# Altium schematic symbol library 13-Logicold 逻辑 IC.SchLib: 297 symbols (part 10 of 30)
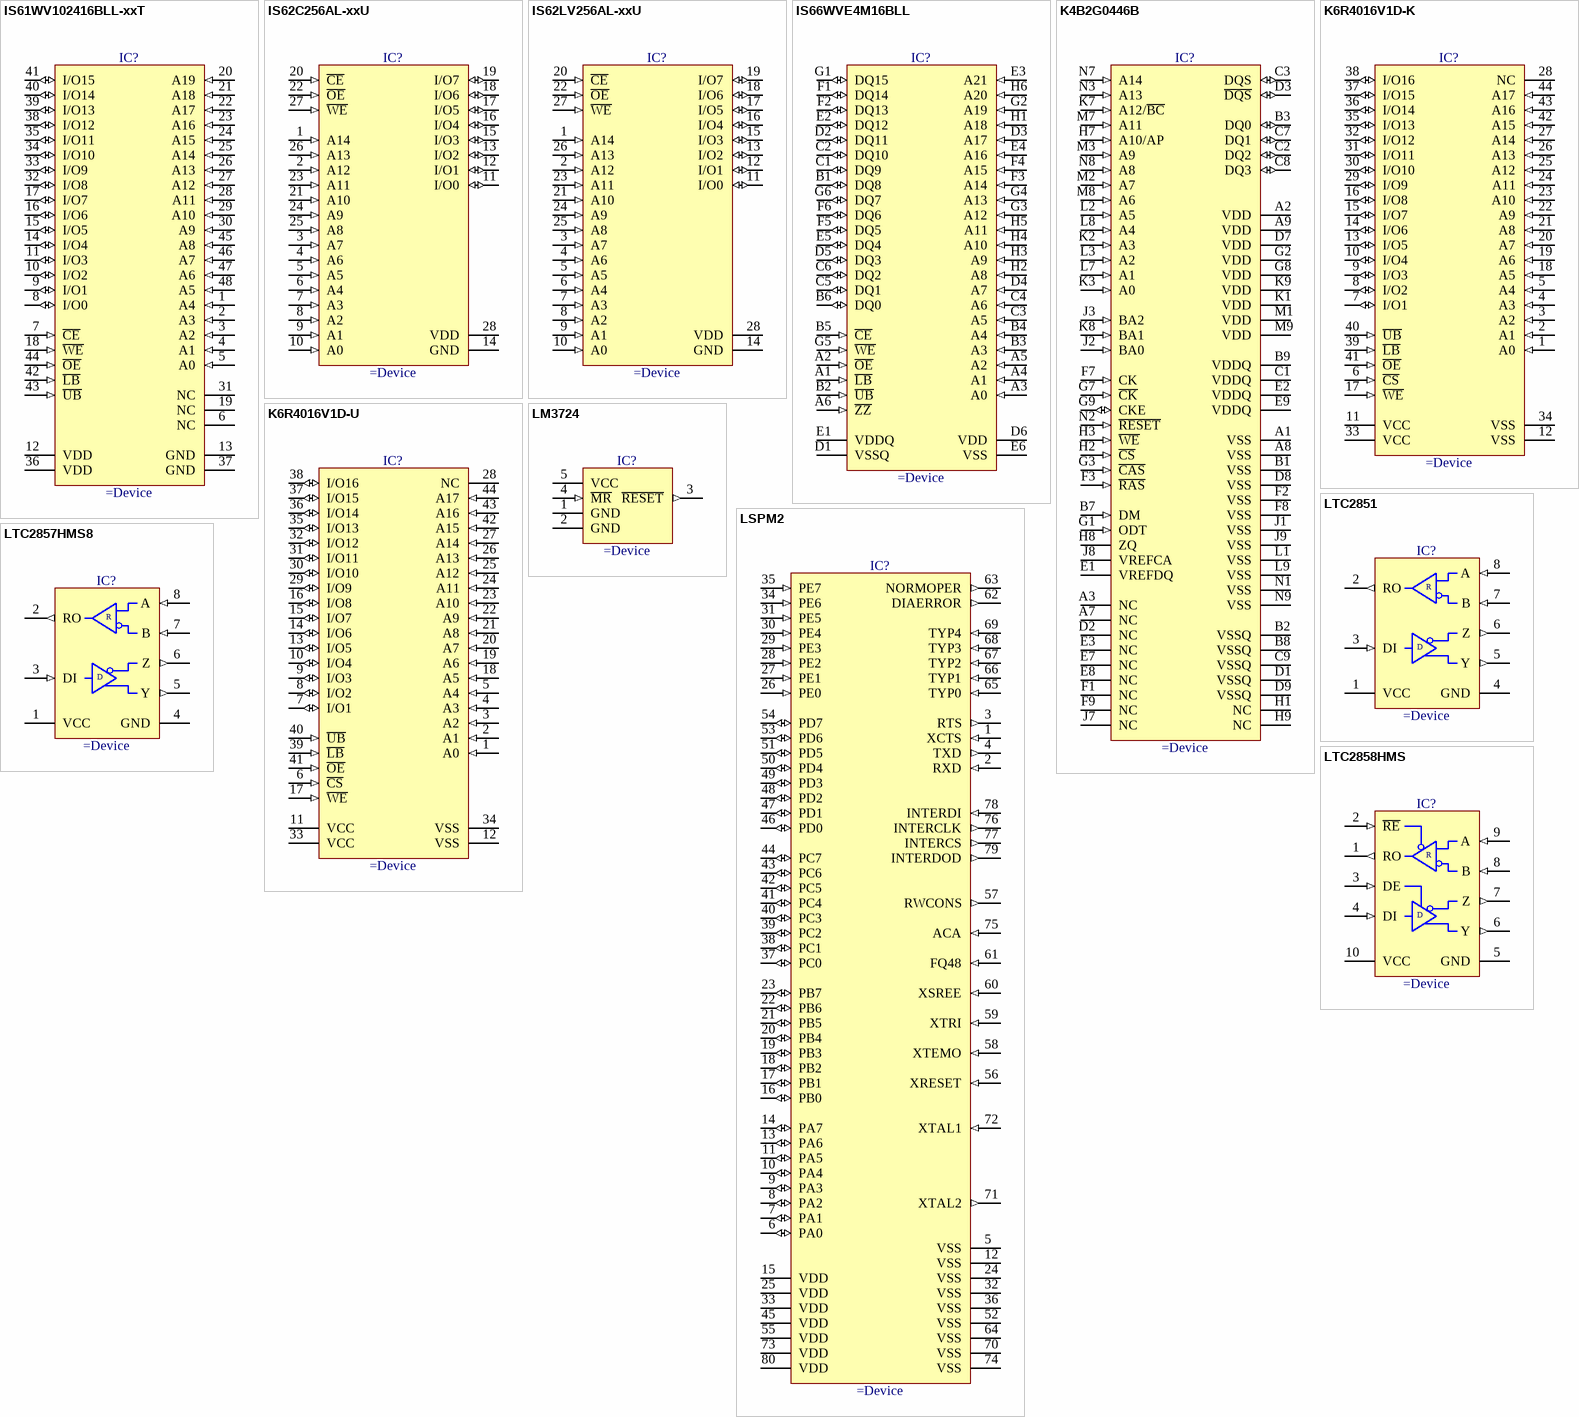
[diagram p171: symbols IS61WV102416BLL-xxT to LTC2858HMS]

## K6R4016V1D-K
designator IC?
4Mbit (256K x 16 Bit) High-Speed CMOS Static RAM
pins: 1 A0 (in), 2 A1 (in), 3 A2 (in), 4 A3 (in), 5 A4 (in), 6 ~{CS} (in), 7 I/O1 (io), 8 I/O2 (io), 9 I/O3 (io), 10 I/O4 (io), 11 VCC (power), 12 VSS (power), 13 I/O5 (io), 14 I/O6 (io), 15 I/O7 (io), 16 I/O8 (io), 17 ~{WE} (in), 18 A5 (in), 19 A6 (in), 20 A7 (in), 21 A8 (in), 22 A9 (in), 23 A10 (in), 24 A11 (in), 25 A12 (in), 26 A13 (in), 27 A14 (in), 28 NC, 29 I/O9 (io), 30 I/O10 (io), 31 I/O11 (io), 32 I/O12 (io), 33 VCC (power), 34 VSS (power), 35 I/O13 (io), 36 I/O14 (io), 37 I/O15 (io), 38 I/O16 (io), 39 ~{LB} (in), 40 ~{UB} (in), 41 ~{OE} (in), 42 A15 (in), 43 A16 (in), 44 A17 (in)

## K6R4016V1D-U
designator IC?
4Mbit (256K x 16 Bit) High-Speed CMOS Static RAM
pins: 1 A0 (in), 2 A1 (in), 3 A2 (in), 4 A3 (in), 5 A4 (in), 6 ~{CS} (in), 7 I/O1 (io), 8 I/O2 (io), 9 I/O3 (io), 10 I/O4 (io), 11 VCC (power), 12 VSS (power), 13 I/O5 (io), 14 I/O6 (io), 15 I/O7 (io), 16 I/O8 (io), 17 ~{WE} (in), 18 A5 (in), 19 A6 (in), 20 A7 (in), 21 A8 (in), 22 A9 (in), 23 A10 (in), 24 A11 (in), 25 A12 (in), 26 A13 (in), 27 A14 (in), 28 NC, 29 I/O9 (io), 30 I/O10 (io), 31 I/O11 (io), 32 I/O12 (io), 33 VCC (power), 34 VSS (power), 35 I/O13 (io), 36 I/O14 (io), 37 I/O15 (io), 38 I/O16 (io), 39 ~{LB} (in), 40 ~{UB} (in), 41 ~{OE} (in), 42 A15 (in), 43 A16 (in), 44 A17 (in)

## LM3724
designator IC?
5-Pin Microprocessor Reset Circuit
pins: 1 GND (power), 2 GND (power), 3 ~{RESET} (out), 4 ~{MR} (in), 5 VCC (power)

## LSPM2
designator IC?
ASIC PROFIBUS Multiplexer
pins: 1 XCTS (in), 2 RXD (in), 3 RTS (out), 4 TXD (out), 5 VSS (power), 6 PA0 (io), 7 PA1 (io), 8 PA2 (io), 9 PA3 (io), 10 PA4 (io), 11 PA5 (io), 12 VSS (power), 13 PA6 (io), 14 PA7 (io), 15 VDD (power), 16 PB0 (io), 17 PB1 (io), 18 PB2 (io), 19 PB3 (io), 20 PB4 (io), 21 PB5 (io), 22 PB6 (io), 23 PB7 (io), 24 VSS (power), 25 VDD (power), 26 PE0 (in), 27 PE1 (in), 28 PE2 (in), 29 PE3 (in), 30 PE4 (in), 31 PE5 (in), 32 VSS (power), 33 VDD (power), 34 PE6 (in), 35 PE7 (in), 36 VSS (power), 37 PC0 (io), 38 PC1 (io), 39 PC2 (io), 40 PC3 (io), 41 PC4 (io), 42 PC5 (io), 43 PC6 (io), 44 PC7 (io), 45 VDD (power), 46 PD0 (io), 47 PD1 (io), 48 PD2 (io), 49 PD3 (io), 50 PD4 (io), 51 PD5 (io), 52 VSS (power), 53 PD6 (io), 54 PD7 (io), 55 VDD (power), 56 XRESET (in), 57 RWCONS (out), 58 XTEMO (in), 59 XTRI (in), 60 XSREE (in), 61 FQ48 (in), 62 DIAERROR (out), 63 NORMOPER (out), 64 VSS (power), 65 TYP0 (in), 66 TYP1 (in), 67 TYP2 (in), 68 TYP3 (in), 69 TYP4 (in), 70 VSS (power), 71 XTAL2 (out), 72 XTAL1 (in), 73 VDD (power), 74 VSS (power), 75 ACA (in), 76 INTERCLK (out), 77 INTERCS (out), 78 INTERDI (in), 79 INTERDOD (out), 80 VDD (power)

## LTC2851
designator IC?
3.3V 20Mbps RS485/RS422 Transceivers
pins: 1 VCC (power), 2 RO (out), 3 DI (in), 4 GND (power), 5 Y (out), 6 Z (out), 7 B (in), 8 A (in)
text: R; D

## LTC2857HMS8
designator IC?
20Mbps and Slew Rate Limited 15kV RS485/RS422 Transceivers
pins: 1 VCC (power), 2 RO (out), 3 DI (in), 4 GND (power), 5 Y (out), 6 Z (out), 7 B (in), 8 A (in)
text: R; D

## LTC2858HMS
designator IC?
20Mbps and Slew Rate Limited 15kV RS485/RS422 Full Duplex Transceivers With Low Power Shut Down Mode
pins: 1 RO (out), 2 ~{RE} (in), 3 DE (in), 4 DI (in), 5 GND (power), 6 Y (out), 7 Z (out), 8 B (in), 9 A (in), 10 VCC (power)
text: R; D

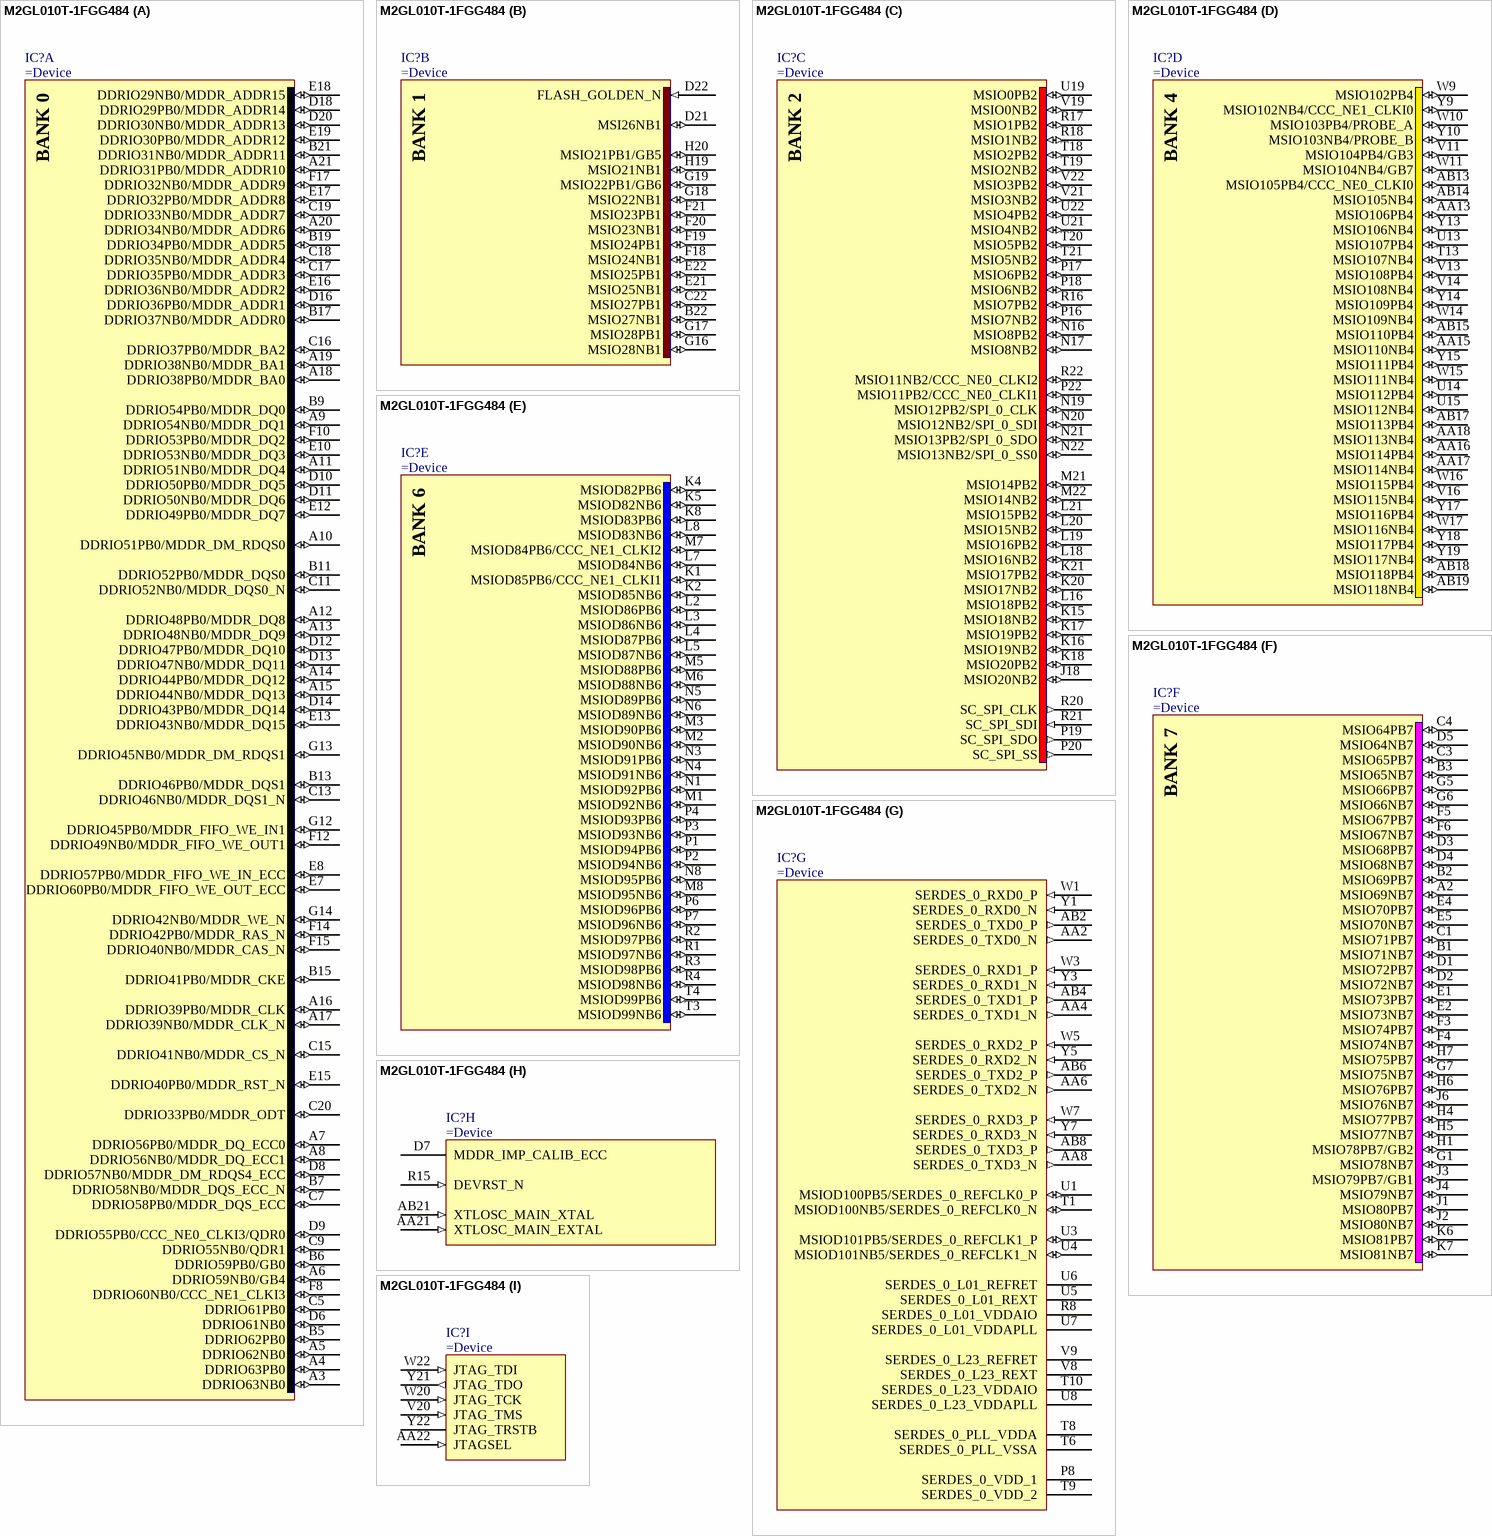
[diagram p56: symbol M2GL010T-1FGG484]

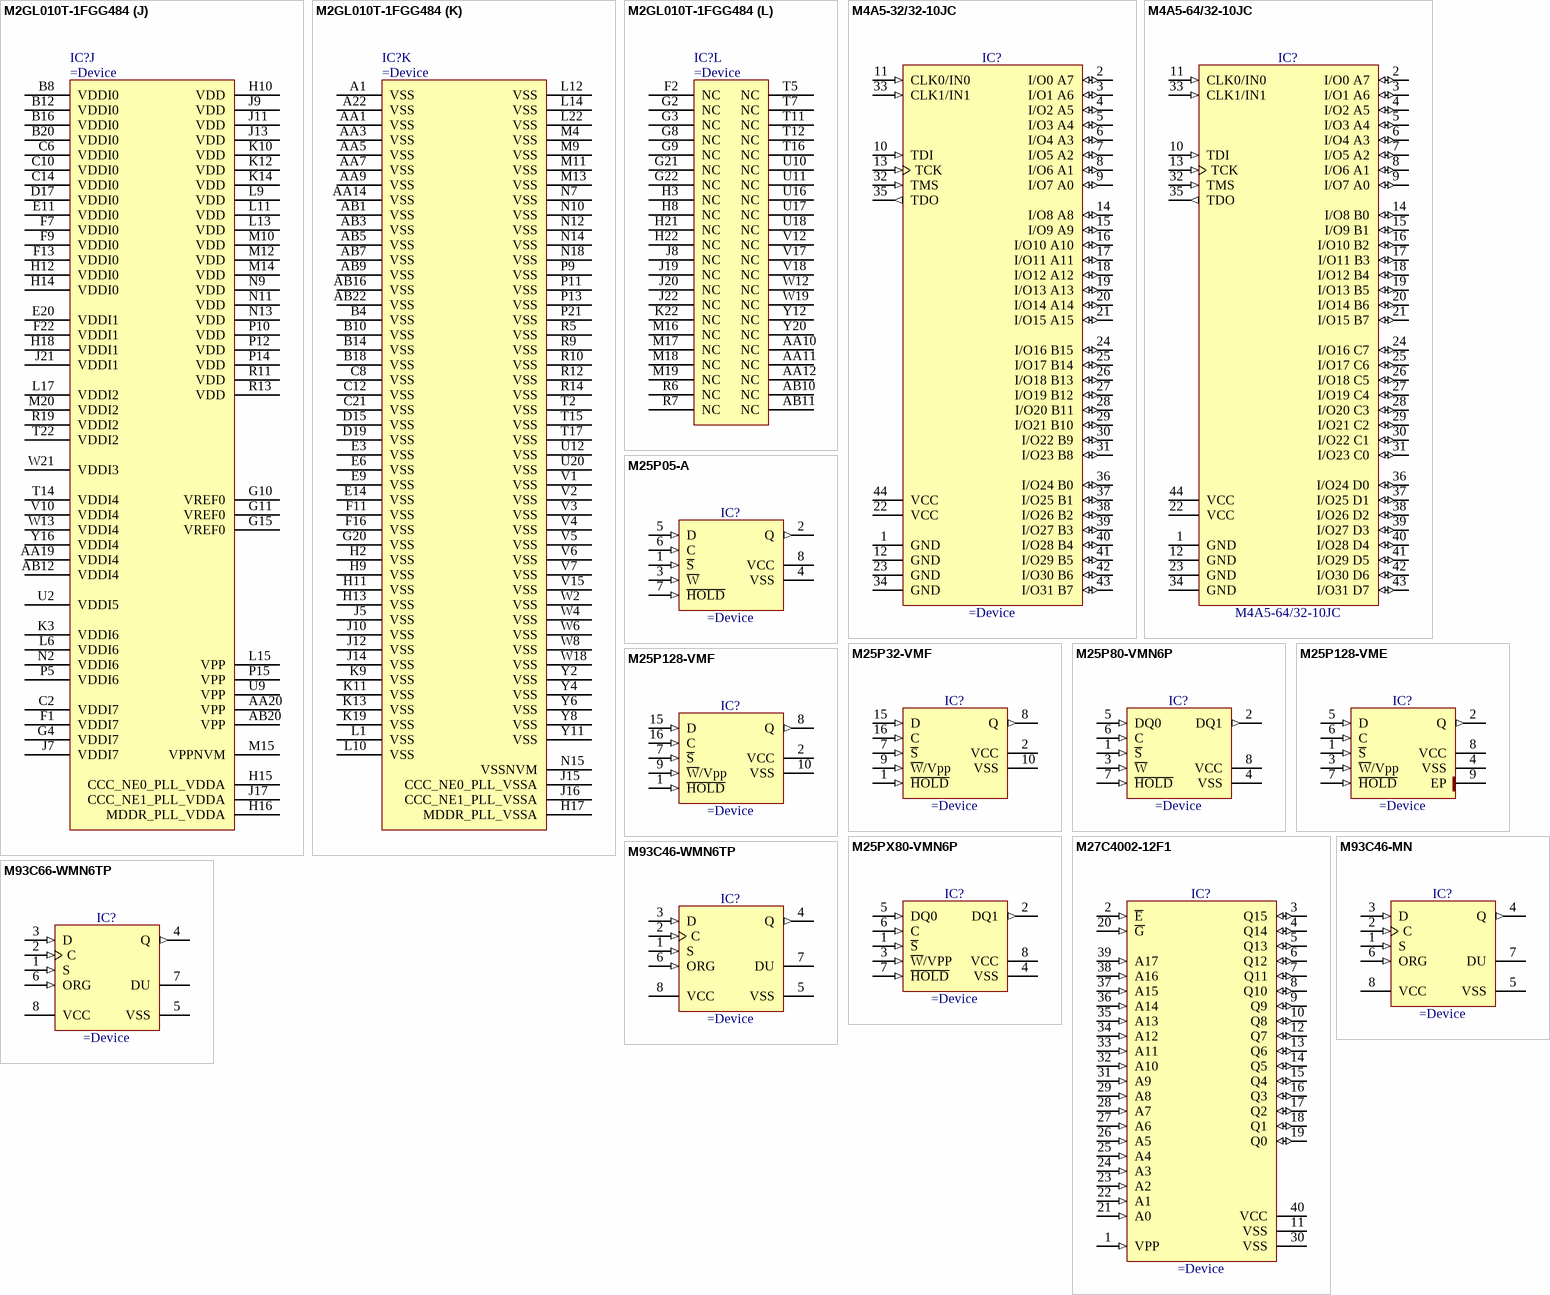
[diagram p57: symbols M2GL010T-1FGG484 to M93C66-WMN6TP]

## M2GL010T-1FGG484
designator IC?
IGLOO2 FPGA, 12084 Cells, 233 User I/Os,  2 PLLs, 912K RAM, 1 PCIe, 484-Pin FBGA, Commercial Grade
part A pins: A3 DDRIO63NB0 (io), A4 DDRIO63PB0 (io), A5 DDRIO62NB0 (io), A6 DDRIO59NB0/GB4 (io), A7 DDRIO56PB0/MDDR_DQ_ECC0 (io), A8 DDRIO56NB0/MDDR_DQ_ECC1 (io), A9 DDRIO54NB0/MDDR_DQ1 (io), A10 DDRIO51PB0/MDDR_DM_RDQS0 (io), A11 DDRIO51NB0/MDDR_DQ4 (io), A12 DDRIO48PB0/MDDR_DQ8 (io), A13 DDRIO48NB0/MDDR_DQ9 (io), A14 DDRIO44PB0/MDDR_DQ12 (io), A15 DDRIO44NB0/MDDR_DQ13 (io), A16 DDRIO39PB0/MDDR_CLK (io), A17 DDRIO39NB0/MDDR_CLK_N (io), A18 DDRIO38PB0/MDDR_BA0 (io), A19 DDRIO38NB0/MDDR_BA1 (io), A20 DDRIO34NB0/MDDR_ADDR6 (io), A21 DDRIO31PB0/MDDR_ADDR10 (io), B5 DDRIO62PB0 (io), B6 DDRIO59PB0/GB0 (io), B7 DDRIO58NB0/MDDR_DQS_ECC_N (io), B9 DDRIO54PB0/MDDR_DQ0 (io), B11 DDRIO52PB0/MDDR_DQS0 (io), B13 DDRIO46PB0/MDDR_DQS1 (io), B15 DDRIO41PB0/MDDR_CKE (io), B17 DDRIO37NB0/MDDR_ADDR0 (io), B19 DDRIO34PB0/MDDR_ADDR5 (io), B21 DDRIO31NB0/MDDR_ADDR11 (io), C5 DDRIO61PB0 (io), C7 DDRIO58PB0/MDDR_DQS_ECC (io), C9 DDRIO55NB0/QDR1 (io), C11 DDRIO52NB0/MDDR_DQS0_N (io), C13 DDRIO46NB0/MDDR_DQS1_N (io), C15 DDRIO41NB0/MDDR_CS_N (io), C16 DDRIO37PB0/MDDR_BA2 (io), C17 DDRIO35PB0/MDDR_ADDR3 (io), C18 DDRIO35NB0/MDDR_ADDR4 (io), C19 DDRIO33NB0/MDDR_ADDR7 (io), C20 DDRIO33PB0/MDDR_ODT (io), D6 DDRIO61NB0 (io), D8 DDRIO57NB0/MDDR_DM_RDQS4_ECC (io), D9 DDRIO55PB0/CCC_NE0_CLKI3/QDR0 (io), D10 DDRIO50PB0/MDDR_DQ5 (io), D11 DDRIO50NB0/MDDR_DQ6 (io), D12 DDRIO47PB0/MDDR_DQ10 (io), D13 DDRIO47NB0/MDDR_DQ11 (io), D14 DDRIO43PB0/MDDR_DQ14 (io), D16 DDRIO36PB0/MDDR_ADDR1 (io), D18 DDRIO29PB0/MDDR_ADDR14 (io), D20 DDRIO30NB0/MDDR_ADDR13 (io), E7 DDRIO60PB0/MDDR_FIFO_WE_OUT_ECC (io), E8 DDRIO57PB0/MDDR_FIFO_WE_IN_ECC (io), E10 DDRIO53NB0/MDDR_DQ3 (io), E12 DDRIO49PB0/MDDR_DQ7 (io), E13 DDRIO43NB0/MDDR_DQ15 (io), E15 DDRIO40PB0/MDDR_RST_N (io), E16 DDRIO36NB0/MDDR_ADDR2 (io), E17 DDRIO32PB0/MDDR_ADDR8 (io), E18 DDRIO29NB0/MDDR_ADDR15 (io), E19 DDRIO30PB0/MDDR_ADDR12 (io), F8 DDRIO60NB0/CCC_NE1_CLKI3 (io), F10 DDRIO53PB0/MDDR_DQ2 (io), F12 DDRIO49NB0/MDDR_FIFO_WE_OUT1 (io), F14 DDRIO42PB0/MDDR_RAS_N (io), F15 DDRIO40NB0/MDDR_CAS_N (io), F17 DDRIO32NB0/MDDR_ADDR9 (io), G12 DDRIO45PB0/MDDR_FIFO_WE_IN1 (io), G13 DDRIO45NB0/MDDR_DM_RDQS1 (io), G14 DDRIO42NB0/MDDR_WE_N (io)
part B pins: B22 MSIO27NB1 (io), C22 MSIO27PB1 (io), D21 MSI26NB1 (io), D22 FLASH_GOLDEN_N (in), E21 MSIO25NB1 (io), E22 MSIO25PB1 (io), F18 MSIO24NB1 (io), F19 MSIO24PB1 (io), F20 MSIO23NB1 (io), F21 MSIO23PB1 (io), G16 MSIO28NB1 (io), G17 MSIO28PB1 (io), G18 MSIO22NB1 (io), G19 MSIO22PB1/GB6 (io), H19 MSIO21NB1 (io), H20 MSIO21PB1/GB5 (io)
part C pins: J18 MSIO20NB2 (io), K15 MSIO18NB2 (io), K16 MSIO19NB2 (io), K17 MSIO19PB2 (io), K18 MSIO20PB2 (io), K20 MSIO17NB2 (io), K21 MSIO17PB2 (io), L16 MSIO18PB2 (io), L18 MSIO16NB2 (io), L19 MSIO16PB2 (io), L20 MSIO15NB2 (io), L21 MSIO15PB2 (io), M21 MSIO14PB2 (io), M22 MSIO14NB2 (io), N16 MSIO8PB2 (io), N17 MSIO8NB2 (io), N19 MSIO12PB2/SPI_0_CLK (io), N20 MSIO12NB2/SPI_0_SDI (io), N21 MSIO13PB2/SPI_0_SDO (io), N22 MSIO13NB2/SPI_0_SS0 (io), P16 MSIO7NB2 (io), P17 MSIO6PB2 (io), P18 MSIO6NB2 (io), P19 SC_SPI_SDO (out), P20 SC_SPI_SS (out), P22 MSIO11PB2/CCC_NE0_CLKI1 (io), R16 MSIO7PB2 (io), R17 MSIO1PB2 (io), R18 MSIO1NB2 (io), R20 SC_SPI_CLK (out), R21 SC_SPI_SDI (in), R22 MSIO11NB2/CCC_NE0_CLKI2 (io), T18 MSIO2PB2 (io), T19 MSIO2NB2 (io), T20 MSIO5PB2 (io), T21 MSIO5NB2 (io), U19 MSIO0PB2 (io), U21 MSIO4NB2 (io), U22 MSIO4PB2 (io), V19 MSIO0NB2 (io), V21 MSIO3NB2 (io), V22 MSIO3PB2 (io)
part D pins: AA13 MSIO106PB4 (io), AA15 MSIO110NB4 (io), AA16 MSIO114PB4 (io), AA17 MSIO114NB4 (io), AA18 MSIO113NB4 (io), AB13 MSIO105PB4/CCC_NE0_CLKI0 (io), AB14 MSIO105NB4 (io), AB15 MSIO110PB4 (io), AB17 MSIO113PB4 (io), AB18 MSIO118PB4 (io), AB19 MSIO118NB4 (io), T13 MSIO107NB4 (io), U13 MSIO107PB4 (io), U14 MSIO112PB4 (io), U15 MSIO112NB4 (io), V11 MSIO104PB4/GB3 (io), V13 MSIO108PB4 (io), V14 MSIO108NB4 (io), V16 MSIO115NB4 (io), W9 MSIO102PB4 (io), W10 MSIO103PB4/PROBE_A (io), W11 MSIO104NB4/GB7 (io), W14 MSIO109NB4 (io), W15 MSIO111NB4 (io), W16 MSIO115PB4 (io), W17 MSIO116NB4 (io), Y9 MSIO102NB4/CCC_NE1_CLKI0 (io), Y10 MSIO103NB4/PROBE_B (io), Y13 MSIO106NB4 (io), Y14 MSIO109PB4 (io), Y15 MSIO111PB4 (io), Y17 MSIO116PB4 (io), Y18 MSIO117PB4 (io), Y19 MSIO117NB4 (io)
part E pins: K1 MSIOD85PB6/CCC_NE1_CLKI1 (io), K2 MSIOD85NB6 (io), K4 MSIOD82PB6 (io), K5 MSIOD82NB6 (io), K8 MSIOD83PB6 (io), L2 MSIOD86PB6 (io), L3 MSIOD86NB6 (io), L4 MSIOD87PB6 (io), L5 MSIOD87NB6 (io), L7 MSIOD84NB6 (io), L8 MSIOD83NB6 (io), M1 MSIOD92NB6 (io), M2 MSIOD90NB6 (io), M3 MSIOD90PB6 (io), M5 MSIOD88PB6 (io), M6 MSIOD88NB6 (io), M7 MSIOD84PB6/CCC_NE1_CLKI2 (io), M8 MSIOD95NB6 (io), N1 MSIOD92PB6 (io), N3 MSIOD91PB6 (io), N4 MSIOD91NB6 (io), N5 MSIOD89PB6 (io), N6 MSIOD89NB6 (io), N8 MSIOD95PB6 (io), P1 MSIOD94PB6 (io), P2 MSIOD94NB6 (io), P3 MSIOD93NB6 (io), P4 MSIOD93PB6 (io), P6 MSIOD96PB6 (io), P7 MSIOD96NB6 (io), R1 MSIOD97NB6 (io), R2 MSIOD97PB6 (io), R3 MSIOD98PB6 (io), R4 MSIOD98NB6 (io), T3 MSIOD99NB6 (io), T4 MSIOD99PB6 (io)
part F pins: A2 MSIO69NB7 (io), B1 MSIO71NB7 (io), B2 MSIO69PB7 (io), B3 MSIO65NB7 (io), C1 MSIO71PB7 (io), C3 MSIO65PB7 (io), C4 MSIO64PB7 (io), D1 MSIO72PB7 (io), D2 MSIO72NB7 (io), D3 MSIO68PB7 (io), D4 MSIO68NB7 (io), D5 MSIO64NB7 (io), E1 MSIO73PB7 (io), E2 MSIO73NB7 (io), E4 MSIO70PB7 (io), E5 MSIO70NB7 (io), F3 MSIO74PB7 (io), F4 MSIO74NB7 (io), F5 MSIO67PB7 (io), F6 MSIO67NB7 (io), G1 MSIO78NB7 (io), G5 MSIO66PB7 (io), G6 MSIO66NB7 (io), G7 MSIO75NB7 (io), H1 MSIO78PB7/GB2 (io), H4 MSIO77PB7 (io), H5 MSIO77NB7 (io), H6 MSIO76PB7 (io), H7 MSIO75PB7 (io), J1 MSIO80PB7 (io), J2 MSIO80NB7 (io), J3 MSIO79PB7/GB1 (io), J4 MSIO79NB7 (io), J6 MSIO76NB7 (io), K6 MSIO81PB7 (io), K7 MSIO81NB7 (io)
part G pins: AA2 SERDES_0_TXD0_N (out), AA4 SERDES_0_TXD1_N (out), AA6 SERDES_0_TXD2_N (out), AA8 SERDES_0_TXD3_N (out), AB2 SERDES_0_TXD0_P (out), AB4 SERDES_0_TXD1_P (out), AB6 SERDES_0_TXD2_P (out), AB8 SERDES_0_TXD3_P (out), P8 SERDES_0_VDD_1 (power), R8 SERDES_0_L01_VDDAIO (power), T1 MSIOD100NB5/SERDES_0_REFCLK0_N (io), T6 SERDES_0_PLL_VSSA (power), T8 SERDES_0_PLL_VDDA (power), T9 SERDES_0_VDD_2 (power), T10 SERDES_0_L23_VDDAIO (power), U1 MSIOD100PB5/SERDES_0_REFCLK0_P (io), U3 MSIOD101PB5/SERDES_0_REFCLK1_P (io), U4 MSIOD101NB5/SERDES_0_REFCLK1_N (io), U5 SERDES_0_L01_REXT (power), U6 SERDES_0_L01_REFRET (power), U7 SERDES_0_L01_VDDAPLL (power), U8 SERDES_0_L23_VDDAPLL (power), V8 SERDES_0_L23_REXT (power), V9 SERDES_0_L23_REFRET (power), W1 SERDES_0_RXD0_P (in), W3 SERDES_0_RXD1_P (in), W5 SERDES_0_RXD2_P (in), W7 SERDES_0_RXD3_P (in), Y1 SERDES_0_RXD0_N (in), Y3 SERDES_0_RXD1_N (in), Y5 SERDES_0_RXD2_N (in), Y7 SERDES_0_RXD3_N (in)
part H pins: AA21 XTLOSC_MAIN_EXTAL (in), AB21 XTLOSC_MAIN_XTAL (in), D7 MDDR_IMP_CALIB_ECC (power), R15 DEVRST_N (in)
part I pins: AA22 JTAGSEL (in), V20 JTAG_TMS (in), W20 JTAG_TCK (in), W22 JTAG_TDI (in), Y21 JTAG_TDO (out), Y22 JTAG_TRSTB
part J pins: AA19 VDDI4 (power), AA20 VPP (power), AB12 VDDI4 (power), AB20 VPP (power), B8 VDDI0 (power), B12 VDDI0 (power), B16 VDDI0 (power), B20 VDDI0 (power), C2 VDDI7 (power), C6 VDDI0 (power), C10 VDDI0 (power), C14 VDDI0 (power), D17 VDDI0 (power), E11 VDDI0 (power), E20 VDDI1 (power), F1 VDDI7 (power), F7 VDDI0 (power), F9 VDDI0 (power), F13 VDDI0 (power), F22 VDDI1 (power), G4 VDDI7 (power), G10 VREF0 (power), G11 VREF0 (power), G15 VREF0 (power), H10 VDD (power), H12 VDDI0 (power), H14 VDDI0 (power), H15 CCC_NE0_PLL_VDDA (power), H16 MDDR_PLL_VDDA (power), H18 VDDI1 (power), J7 VDDI7 (power), J9 VDD (power), J11 VDD (power), J13 VDD (power), J17 CCC_NE1_PLL_VDDA (power), J21 VDDI1 (power), K3 VDDI6 (power), K10 VDD (power), K12 VDD (power), K14 VDD (power), L6 VDDI6 (power), L9 VDD (power), L11 VDD (power), L13 VDD (power), L15 VPP (power), L17 VDDI2 (power), M10 VDD (power), M12 VDD (power), M14 VDD (power), M15 VPPNVM (power), M20 VDDI2 (power), N2 VDDI6 (power), N9 VDD (power), N11 VDD (power), N13 VDD (power), P5 VDDI6 (power), P10 VDD (power), P12 VDD (power), P14 VDD (power), P15 VPP (power), R11 VDD (power), R13 VDD (power), R19 VDDI2 (power), T14 VDDI4 (power), T22 VDDI2 (power), U2 VDDI5 (power), U9 VPP (power), V10 VDDI4 (power), W13 VDDI4 (power), W21 VDDI3 (power), Y16 VDDI4 (power)
part K pins: A1 VSS (power), A22 VSS (power), AA1 VSS (power), AA3 VSS (power), AA5 VSS (power), AA7 VSS (power), AA9 VSS (power), AA14 VSS (power), AB1 VSS (power), AB3 VSS (power), AB5 VSS (power), AB7 VSS (power), AB9 VSS (power), AB16 VSS (power), AB22 VSS (power), B4 VSS (power), B10 VSS (power), B14 VSS (power), B18 VSS (power), C8 VSS (power), C12 VSS (power), C21 VSS (power), D15 VSS (power), D19 VSS (power), E3 VSS (power), E6 VSS (power), E9 VSS (power), E14 VSS (power), F11 VSS (power), F16 VSS (power), G20 VSS (power), H2 VSS (power), H9 VSS (power), H11 VSS (power), H13 VSS (power), H17 MDDR_PLL_VSSA (power), J5 VSS (power), J10 VSS (power), J12 VSS (power), J14 VSS (power), J15 CCC_NE0_PLL_VSSA (power), J16 CCC_NE1_PLL_VSSA (power), K9 VSS (power), K11 VSS (power), K13 VSS (power), K19 VSS (power), L1 VSS (power), L10 VSS (power), L12 VSS (power), L14 VSS (power), L22 VSS (power), M4 VSS (power), M9 VSS (power), M11 VSS (power), M13 VSS (power), N7 VSS (power), N10 VSS (power), N12 VSS (power), N14 VSS (power), N15 VSSNVM (power), N18 VSS (power), P9 VSS (power), P11 VSS (power), P13 VSS (power), P21 VSS (power), R5 VSS (power), R9 VSS (power), R10 VSS (power), R12 VSS (power), R14 VSS (power), T2 VSS (power), T15 VSS (power), T17 VSS (power), U12 VSS (power), U20 VSS (power), V1 VSS (power), V2 VSS (power), V3 VSS (power), V4 VSS (power), V5 VSS (power), V6 VSS (power), V7 VSS (power), V15 VSS (power), W2 VSS (power), W4 VSS (power), W6 VSS (power), W8 VSS (power), W18 VSS (power), Y2 VSS (power), Y4 VSS (power), Y6 VSS (power), Y8 VSS (power), Y11 VSS (power)
part L pins: AA10 NC, AA11 NC, AA12 NC, AB10 NC, AB11 NC, F2 NC, G2 NC, G3 NC, G8 NC, G9 NC, G21 NC, G22 NC, H3 NC, H8 NC, H21 NC, H22 NC, J8 NC, J19 NC, J20 NC, J22 NC, K22 NC, M16 NC, M17 NC, M18 NC, M19 NC, R6 NC, R7 NC, T5 NC, T7 NC, T11 NC, T12 NC, T16 NC, U10 NC, U11 NC, U16 NC, U17 NC, U18 NC, V12 NC, V17 NC, V18 NC, W12 NC, W19 NC, Y12 NC, Y20 NC
part A text: BANK 0
part B text: BANK 1
part C text: BANK 2
part D text: BANK 4
part E text: BANK 6
part F text: BANK 7

## M4A5-32/32-10JC
designator IC?
High-Performance EE CMOS In-System Programmable Logic
pins: 1 GND (power), 2 I/O0 A7 (io), 3 I/O1 A6 (io), 4 I/O2 A5 (io), 5 I/O3 A4 (io), 6 I/O4 A3 (io), 7 I/O5 A2 (io), 8 I/O6 A1 (io), 9 I/O7 A0 (io), 10 TDI (in), 11 CLK0/IN0 (in), 12 GND (power), 13 TCK (in), 14 I/O8 A8 (io), 15 I/O9 A9 (io), 16 I/O10 A10 (io), 17 I/O11 A11 (io), 18 I/O12 A12 (io), 19 I/O13 A13 (io), 20 I/O14 A14 (io), 21 I/O15 A15 (io), 22 VCC (power), 23 GND (power), 24 I/O16 B15 (io), 25 I/O17 B14 (io), 26 I/O18 B13 (io), 27 I/O19 B12 (io), 28 I/O20 B11 (io), 29 I/O21 B10 (io), 30 I/O22 B9 (io), 31 I/O23 B8 (io), 32 TMS (in), 33 CLK1/IN1 (in), 34 GND (power), 35 TDO (out), 36 I/O24 B0 (io), 37 I/O25 B1 (io), 38 I/O26 B2 (io), 39 I/O27 B3 (io), 40 I/O28 B4 (io), 41 I/O29 B5 (io), 42 I/O30 B6 (io), 43 I/O31 B7 (io), 44 VCC (power)

## M4A5-64/32-10JC
designator IC?
High-Performance EE CMOS In-System Programmable Logic
pins: 1 GND (power), 2 I/O0 A7 (io), 3 I/O1 A6 (io), 4 I/O2 A5 (io), 5 I/O3 A4 (io), 6 I/O4 A3 (io), 7 I/O5 A2 (io), 8 I/O6 A1 (io), 9 I/O7 A0 (io), 10 TDI (in), 11 CLK0/IN0 (in), 12 GND (power), 13 TCK (in), 14 I/O8 B0 (io), 15 I/O9 B1 (io), 16 I/O10 B2 (io), 17 I/O11 B3 (io), 18 I/O12 B4 (io), 19 I/O13 B5 (io), 20 I/O14 B6 (io), 21 I/O15 B7 (io), 22 VCC (power), 23 GND (power), 24 I/O16 C7 (io), 25 I/O17 C6 (io), 26 I/O18 C5 (io), 27 I/O19 C4 (io), 28 I/O20 C3 (io), 29 I/O21 C2 (io), 30 I/O22 C1 (io), 31 I/O23 C0 (io), 32 TMS (in), 33 CLK1/IN1 (in), 34 GND (power), 35 TDO (out), 36 I/O24 D0 (io), 37 I/O25 D1 (io), 38 I/O26 D2 (io), 39 I/O27 D3 (io), 40 I/O28 D4 (io), 41 I/O29 D5 (io), 42 I/O30 D6 (io), 43 I/O31 D7 (io), 44 VCC (power)